# Altium schematic symbol library IC_TI.SCHLIB: 1162 symbols (part 6 of 8) (continued)
## SN74LVC1G17QDBVRQ1
designator U?
Integrated Circuit; Manufacturer_Name: Texas Instruments; Manufacturer_Part_Number: SN74LVC1G17QDBVRQ1; Datasheet Link: http://www.ti.com/lit/gpn/sn74lvc1g17-q1; Height: 1.45mm; Mouser Part Number: 595-74LVC1G17QDBVRQ1; Mouser Price/Stock: https://www.mouser.com/Search/Refine.aspx?Keyword=595-74LVC1G17QDBVRQ1
footprint SOT23-5 (SOT23, 5-Leads, Body 3.0x3.0mm (max), Pitch 0.95mm, IPC Medium Density)
pins: 1 NC, 2 A, 3 GND, 4 Y, 5 VCC

## SN74LVC1G32DBVR
designator U?
Integrated Circuit; Manufacturer_Name: Texas Instruments; Manufacturer_Part_Number: SN74LVC1G32DBVR; Datasheet Link: http://www.ti.com/lit/gpn/sn74lvc1g32; Height: 1.45mm; Mouser Part Number: 595-SN74LVC1G32DBVR; Mouser Price/Stock: https://www.mouser.com/Search/Refine.aspx?Keyword=595-SN74LVC1G32DBVR; RS Part Number: 1788963; RS Price/Stock: http://uk.rs-online.com/web/p/products/1788963
footprint SOT23-5 (SOT23, 5-Leads, Body 3.0x3.0mm (max), Pitch 0.95mm, IPC Medium Density)
pins: 1 A, 2 B, 3 GND, 4 Y, 5 VCC

## SN74LVC1G66DBVRG4
designator U?
Integrated Circuit; Manufacturer_Name: Texas Instruments; Manufacturer_Part_Number: SN74LVC1G66DBVRG4; Datasheet Link: http://www.ti.com/lit/ds/symlink/sn74lvc1g66.pdf; Height: 1.45mm; Mouser Part Number: 595-SN74LVC1G66DBVRG; Mouser Price/Stock: https://www.mouser.com/Search/Refine.aspx?Keyword=595-SN74LVC1G66DBVRG
footprint SOT23-5 (SOT23, 5-Leads, Body 3.0x3.0mm (max), Pitch 0.95mm, IPC Medium Density)
pins: 1 A, 2 B, 3 GND, 4 C, 5 VCC

## SN74LVC1G79DCKT
designator U?
Integrated Circuit; Manufacturer_Name: Texas Instruments; Manufacturer_Part_Number: SN74LVC1G79DCKT; Datasheet Link: http://www.ti.com/lit/ds/symlink/sn74lvc1g79.pdf; Height: 1.1mm; Mouser Part Number: 595-SN74LVC1G79DCKT; Mouser Price/Stock: https://www.mouser.com/Search/Refine.aspx?Keyword=595-SN74LVC1G79DCKT; RS Part Number: 6628806P; RS Price/Stock: http://uk.rs-online.com/web/p/products/6628806P
footprint SOT353
pins: 1 D, 2 CLK, 3 GND, 4 Q, 5 VCC

## SN74LVC1G80DBVT
designator U?
Integrated Circuit; Manufacturer_Name: Texas Instruments; Manufacturer_Part_Number: SN74LVC1G80DBVT; Mouser Part Number: 595-SN74LVC1G80DBVT; Mouser Price/Stock: https://www.mouser.com/Search/Refine.aspx?Keyword=595-SN74LVC1G80DBVT; RS Part Number: 1455779; RS Price/Stock: http://uk.rs-online.com/web/p/products/1455779
footprint SOT23-5 (SOT23, 5-Leads, Body 3.0x3.0mm (max), Pitch 0.95mm, IPC Medium Density)
pins: 1 D, 2 CLK, 3 GND, 4 ~Q, 5 VCC

## SN74LVC1G86DCKR
designator U?
Integrated Circuit; Manufacturer_Name: Texas Instruments; Manufacturer_Part_Number: SN74LVC1G86DCKR; Datasheet Link: http://www.ti.com/lit/gpn/sn74lvc1g86; Mouser Part Number: 595-SN74LVC1G86DCKR; Mouser Price/Stock: https://www.mouser.com/Search/Refine.aspx?Keyword=595-SN74LVC1G86DCKR; RS Part Number: 7968256P; RS Price/Stock: http://uk.rs-online.com/web/p/products/7968256P
footprint SOT353
pins: 1 A, 2 B, 3 GND, 4 Y, 5 VCC

## SN74LVC1G123DCUR
designator U??
Undefined or Miscellaneous; Manufacturer_Name: Texas Instruments; Manufacturer_Part_Number: SN74LVC1G123DCUR; Datasheet Link: http://www.ti.com/lit/gpn/sn74lvc1g123; Height: 0.9mm; Mouser Part Number: 595-SN74LVC1G123DCUR; Mouser Price/Stock: https://www.mouser.com/Search/Refine.aspx?Keyword=595-SN74LVC1G123DCUR
footprint VSSOP8_0.5(3X2)
pins: 1 ~{A} (in), 2 B (in), 3 ~{CLR}, 4 GND (power), 5 Q (out), 6 CEXT, 7 REXT/CEXT, 8 VCC (power)

## SN74LVC1G125DBVR
designator U?
Integrated Circuit; Manufacturer_Name: Texas Instruments; Manufacturer_Part_Number: SN74LVC1G125DBVR; Datasheet Link: http://www.ti.com/lit/ds/symlink/sn74lvc1g125.pdf; Height: 1.45mm; Mouser Part Number: 595-SN74LVC1G125DBVR; Mouser Price/Stock: https://www.mouser.com/Search/Refine.aspx?Keyword=595-SN74LVC1G125DBVR; RS Part Number: 1218441; RS Price/Stock: http://uk.rs-online.com/web/p/products/1218441
footprint SOT23-5 (SOT23, 5-Leads, Body 3.0x3.0mm (max), Pitch 0.95mm, IPC Medium Density)
pins: 1 ~{OE}, 2 A, 3 GND (power), 4 Y, 5 VCC (power)

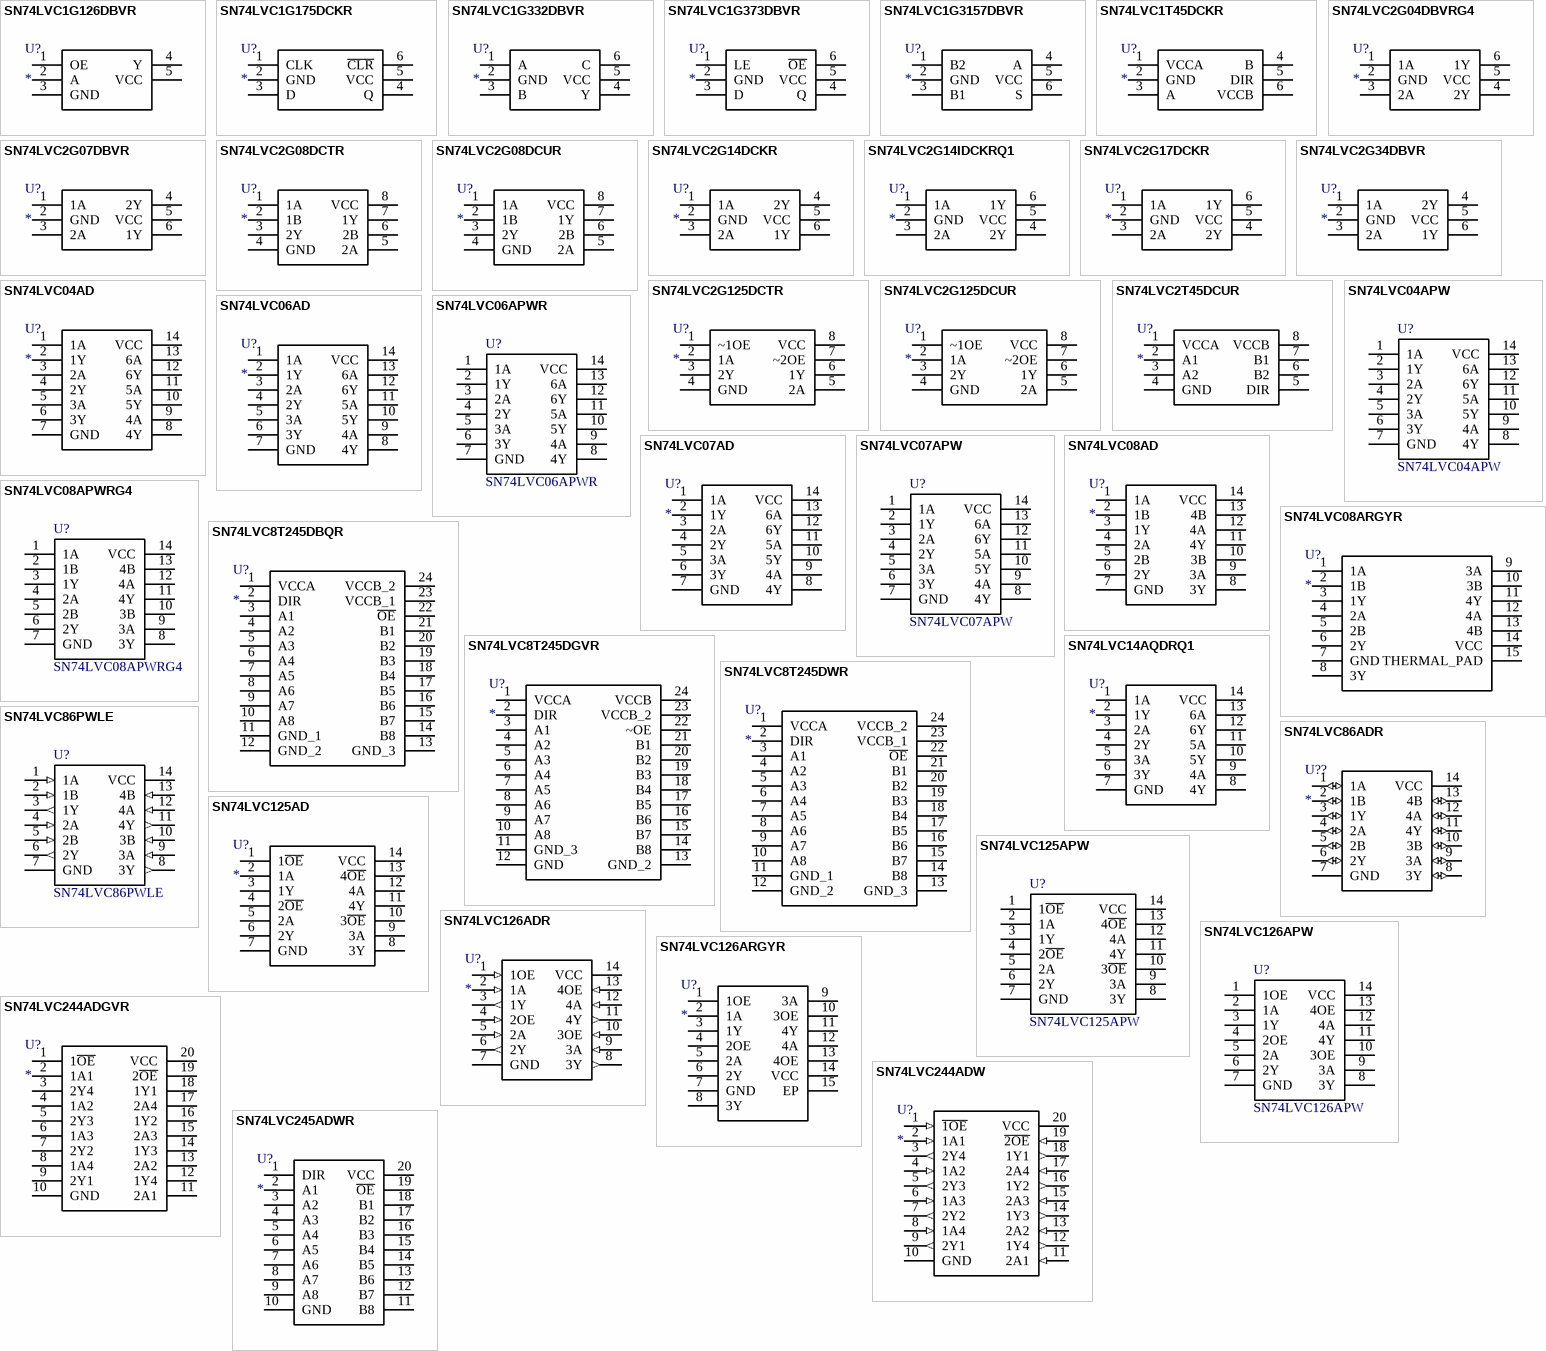
[diagram p24: symbols SN74LVC1G126DBVR to SN74LVC245ADWR]

## SN74LVC1G126DBVR
designator U?
Integrated Circuit; Manufacturer_Name: Texas Instruments; Manufacturer_Part_Number: SN74LVC1G126DBVR; Datasheet Link: http://www.ti.com/lit/ds/symlink/sn74lvc1g126.pdf; Height: 1.45mm; Mouser Part Number: 595-SN74LVC1G126DBVR; Mouser Price/Stock: https://www.mouser.com/Search/Refine.aspx?Keyword=595-SN74LVC1G126DBVR; RS Part Number: 1626704; RS Price/Stock: http://uk.rs-online.com/web/p/products/1626704
footprint SOT23-5 (SOT23, 5-Leads, Body 3.0x3.0mm (max), Pitch 0.95mm, IPC Medium Density)
pins: 1 OE, 2 A, 3 GND, 4 Y, 5 VCC

## SN74LVC1G175DCKR
designator U?
Integrated Circuit; Manufacturer_Name: Texas Instruments; Manufacturer_Part_Number: SN74LVC1G175DCKR; Datasheet Link: http://www.ti.com/lit/gpn/sn74lvc1g175; Height: 1.1mm; Mouser Part Number: 595-SN74LVC1G175DCKR; Mouser Price/Stock: https://www.mouser.com/Search/Refine.aspx?Keyword=595-SN74LVC1G175DCKR
footprint SC70-6 (SOT23, 6-Leads, Body 2.2x2.4mm (max), Pitch 0.65mm, IPC Medium Density)
pins: 1 CLK, 2 GND, 3 D, 4 Q, 5 VCC, 6 ~{CLR}

## SN74LVC1G332DBVR
designator U?
Integrated Circuit; Manufacturer_Name: Texas Instruments; Manufacturer_Part_Number: SN74LVC1G332DBVR; Datasheet Link: http://uk.rs-online.com/web/p/products/8096006; Height: 1.45mm; Mouser Part Number: 595-SN74LVC1G332DBVR; Mouser Price/Stock: https://www.mouser.com/Search/Refine.aspx?Keyword=595-SN74LVC1G332DBVR; RS Part Number: 1626715; RS Price/Stock: http://uk.rs-online.com/web/p/products/1626715
footprint SOT23-6
pins: 1 A, 2 GND, 3 B, 4 Y, 5 VCC, 6 C

## SN74LVC1G373DBVR
designator U?
Integrated Circuit; Manufacturer_Name: Texas Instruments; Manufacturer_Part_Number: SN74LVC1G373DBVR; Datasheet Link: http://www.ti.com/lit/gpn/sn74lvc1g373; Height: 1.45mm; Mouser Part Number: 595-SN74LVC1G373DBVR; Mouser Price/Stock: https://www.mouser.com/Search/Refine.aspx?Keyword=595-SN74LVC1G373DBVR
footprint SOT23-6
pins: 1 LE, 2 GND, 3 D, 4 Q, 5 VCC, 6 ~{OE}

## SN74LVC1G3157DBVR
designator U?
Integrated Circuit; Manufacturer_Name: Texas Instruments; Manufacturer_Part_Number: SN74LVC1G3157DBVR; Datasheet Link: http://componentsearchengine.com/Datasheets/1/SN74LVC1G3157DBVR.pdf; Mouser Part Number: 595-SN74LVC1G3157DBV; Mouser Price/Stock: https://www.mouser.com/Search/Refine.aspx?Keyword=595-SN74LVC1G3157DBV; RS Part Number: 1626711; RS Price/Stock: http://uk.rs-online.com/web/p/products/1626711
footprint SOT23-6
pins: 1 B2, 2 GND, 3 B1, 4 A, 5 VCC, 6 S

## SN74LVC1T45DCKR
designator U?
Integrated Circuit; Manufacturer_Name: Texas Instruments; Manufacturer_Part_Number: SN74LVC1T45DCKR; Datasheet Link: http://www.ti.com/lit/gpn/sn74lvc1t45; Mouser Part Number: 595-SN74LVC1T45DCKR; Mouser Price/Stock: https://www.mouser.com/Search/Refine.aspx?Keyword=595-SN74LVC1T45DCKR; RS Part Number: 7968262P; RS Price/Stock: http://uk.rs-online.com/web/p/products/7968262P
footprint SOT363
pins: 1 VCCA, 2 GND, 3 A, 4 B, 5 DIR, 6 VCCB

## SN74LVC2G04DBVRG4
designator U?
Integrated Circuit; Manufacturer_Name: Texas Instruments; Manufacturer_Part_Number: SN74LVC2G04DBVRG4; Datasheet Link: http://www.ti.com/lit/ds/symlink/sn74lvc2g04.pdf; Height: 1.45mm; Mouser Part Number: 595-74LVC2G04DBVRG4; Mouser Price/Stock: https://www.mouser.com/Search/Refine.aspx?Keyword=595-74LVC2G04DBVRG4
footprint SOT23-6
pins: 1 1A, 2 GND, 3 2A, 4 2Y, 5 VCC, 6 1Y

## SN74LVC2G07DBVR
designator U?
Integrated Circuit; Manufacturer_Name: Texas Instruments; Manufacturer_Part_Number: SN74LVC2G07DBVR; Datasheet Link: http://componentsearchengine.com/Datasheets/3/SN74LVC2G07DBVR.pdf; Mouser Part Number: 595-SN74LVC2G07DBVR; Mouser Price/Stock: https://www.mouser.com/Search/Refine.aspx?Keyword=595-SN74LVC2G07DBVR; RS Part Number: 6628913P; RS Price/Stock: http://uk.rs-online.com/web/p/products/6628913P
footprint SOT23-6
pins: 1 1A, 2 GND, 3 2A, 4 2Y, 5 VCC, 6 1Y

## SN74LVC2G08DCTR
designator U?
Integrated Circuit; Manufacturer_Name: Texas Instruments; Manufacturer_Part_Number: SN74LVC2G08DCTR; Datasheet Link: http://www.ti.com/lit/ds/symlink/sn74lvc2g08.pdf; Height: 1.3mm; Mouser Part Number: 595-SN74LVC2G08DCTR; Mouser Price/Stock: https://www.mouser.com/Search/Refine.aspx?Keyword=595-SN74LVC2G08DCTR; RS Part Number: 1627492; RS Price/Stock: http://uk.rs-online.com/web/p/products/1627492
footprint VSSOP8_0.65(4X3)
pins: 1 1A, 2 1B, 3 2Y, 4 GND (power), 5 2A, 6 2B, 7 1Y, 8 VCC (power)

## SN74LVC2G08DCUR
designator U?
Integrated Circuit; Manufacturer_Name: Texas Instruments; Manufacturer_Part_Number: SN74LVC2G08DCUR; Datasheet Link: http://www.ti.com/lit/ds/symlink/sn74lvc2g08.pdf; Height: 0.9mm; Mouser Part Number: 595-SN74LVC2G08DCUR; Mouser Price/Stock: https://www.mouser.com/Search/Refine.aspx?Keyword=595-SN74LVC2G08DCUR; RS Part Number: 1626723; RS Price/Stock: http://uk.rs-online.com/web/p/products/1626723
footprint VSSOP8_0.5(3X2)
pins: 1 1A, 2 1B, 3 2Y, 4 GND (power), 5 2A, 6 2B, 7 1Y, 8 VCC (power)

## SN74LVC2G14DCKR
designator U?
Integrated Circuit; Manufacturer_Name: Texas Instruments; Manufacturer_Part_Number: SN74LVC2G14DCKR; Datasheet Link: http://www.ti.com/lit/gpn/sn74lvc2g14; Mouser Part Number: 595-SN74LVC2G14DCKR; Mouser Price/Stock: https://www.mouser.com/Search/Refine.aspx?Keyword=595-SN74LVC2G14DCKR
footprint SOT363
pins: 1 1A, 2 GND, 3 2A, 4 2Y, 5 VCC, 6 1Y

## SN74LVC2G14IDCKRQ1
designator U?
Integrated Circuit; Manufacturer_Name: Texas Instruments; Manufacturer_Part_Number: SN74LVC2G14IDCKRQ1; Datasheet Link: http://www.ti.com/lit/ds/symlink/sn74lvc2g14-q1.pdf; Height: 1.1mm; Mouser Part Number: 595-SN74LVC2G14IDCQ1; Mouser Price/Stock: https://www.mouser.com/Search/Refine.aspx?Keyword=595-SN74LVC2G14IDCQ1; RS Part Number: 6628932P; RS Price/Stock: http://uk.rs-online.com/web/p/products/6628932P
footprint SOT363
pins: 1 1A, 2 GND (power), 3 2A, 4 2Y, 5 VCC (power), 6 1Y

## SN74LVC2G17DCKR
designator U?
Integrated Circuit; Manufacturer_Name: Texas Instruments; Manufacturer_Part_Number: SN74LVC2G17DCKR; Datasheet Link: http://docs-emea.rs-online.com/webdocs/13f6/0900766b813f622d.pdf; Height: 1.1mm; Mouser Part Number: 595-SN74LVC2G17DCKR; Mouser Price/Stock: https://www.mouser.com/Search/Refine.aspx?Keyword=595-SN74LVC2G17DCKR; RS Part Number: 6628948P; RS Price/Stock: http://uk.rs-online.com/web/p/products/6628948P
footprint SC70-6 (SOT23, 6-Leads, Body 2.2x2.4mm (max), Pitch 0.65mm, IPC Medium Density)
pins: 1 1A, 2 GND (power), 3 2A, 4 2Y, 5 VCC (power), 6 1Y

## SN74LVC2G34DBVR
designator U?
Integrated Circuit; Manufacturer_Name: Texas Instruments; Manufacturer_Part_Number: SN74LVC2G34DBVR; Datasheet Link: http://www.ti.com/lit/gpn/sn74lvc2g34; Mouser Part Number: 595-SN74LVC2G34DBVR; Mouser Price/Stock: https://www.mouser.com/Search/Refine.aspx?Keyword=595-SN74LVC2G34DBVR; RS Part Number: 6628963P; RS Price/Stock: http://uk.rs-online.com/web/p/products/6628963P
footprint SOT23-6
pins: 1 1A, 2 GND, 3 2A, 4 2Y, 5 VCC, 6 1Y

## SN74LVC2G125DCTR
designator U?
Integrated Circuit; Manufacturer_Name: Texas Instruments; Manufacturer_Part_Number: SN74LVC2G125DCTR; Datasheet Link: http://www.ti.com/lit/gpn/sn74lvc2g125; Mouser Part Number: 595-SN74LVC2G125DCTR; Mouser Price/Stock: https://www.mouser.com/Search/Refine.aspx?Keyword=595-SN74LVC2G125DCTR; RS Part Number: 8096043P; RS Price/Stock: http://uk.rs-online.com/web/p/products/8096043P
footprint VSSOP8_0.65(4X3)
pins: 1 ~1OE, 2 1A, 3 2Y, 4 GND, 5 2A, 6 1Y, 7 ~2OE, 8 VCC

## SN74LVC2G125DCUR
designator U?
Integrated Circuit; Manufacturer_Name: Texas Instruments; Manufacturer_Part_Number: SN74LVC2G125DCUR; Datasheet Link: http://www.ti.com/lit/gpn/sn74lvc2g125; Mouser Part Number: 595-SN74LVC2G125DCUR; Mouser Price/Stock: https://www.mouser.com/Search/Refine.aspx?Keyword=595-SN74LVC2G125DCUR; RS Part Number: 1626725; RS Price/Stock: http://uk.rs-online.com/web/p/products/1626725
footprint VSSOP8_0.5(3X2)
pins: 1 ~1OE, 2 1A, 3 2Y, 4 GND, 5 2A, 6 1Y, 7 ~2OE, 8 VCC

## SN74LVC2T45DCUR
designator U?
Integrated Circuit; Manufacturer_Name: Texas Instruments; Manufacturer_Part_Number: SN74LVC2T45DCUR; Datasheet Link: http://www.ti.com/lit/gpn/sn74lvc2t45; Height: 0.9mm; Mouser Part Number: 595-SN74LVC2T45DCUR; Mouser Price/Stock: https://www.mouser.com/Search/Refine.aspx?Keyword=595-SN74LVC2T45DCUR; RS Part Number: 1684367; RS Price/Stock: http://uk.rs-online.com/web/p/products/1684367
footprint VSSOP8_0.5(3X2)
pins: 1 VCCA, 2 A1, 3 A2, 4 GND, 5 DIR, 6 B2, 7 B1, 8 VCCB

## SN74LVC04AD
designator U?
Integrated Circuit; Manufacturer_Name: Texas Instruments; Manufacturer_Part_Number: SN74LVC04AD; Datasheet Link: http://www.ti.com/lit/ds/symlink/sn74lvc04a.pdf; Height: 1.75mm; Mouser Part Number: 595-SN74LVC04AD; Mouser Price/Stock: https://www.mouser.com/Search/Refine.aspx?Keyword=595-SN74LVC04AD; RS Part Number: 0528101; RS Price/Stock: http://uk.rs-online.com/web/p/products/0528101
footprint SOIC14_1.27
pins: 1 1A, 2 1Y, 3 2A, 4 2Y, 5 3A, 6 3Y, 7 GND (power), 8 4Y, 9 4A, 10 5Y, 11 5A, 12 6Y, 13 6A, 14 VCC (power)

## SN74LVC04APW
designator U?
Integrated Circuit; Manufacturer_Name: Texas Instruments; Datasheet Link: http://www.ti.com/lit/gpn/sn74lvc04a; Manufacturer_Part_Number: SN74LVC04APW; Mouser Part Number: 595-SN74LVC04APW; Mouser Price/Stock: https://www.mouser.com/Search/Refine.aspx?Keyword=595-SN74LVC04APW
footprint TSSOP14_0.65 (TSOP, 14-Leads, Body 5.00x4.40mm, Pitch 0.65mm, Thermal Pad 2.31x2.46mm, IPC Low Density)
pins: 1 1A, 2 1Y, 3 2A, 4 2Y, 5 3A, 6 3Y, 7 GND, 8 4Y, 9 4A, 10 5Y, 11 5A, 12 6Y, 13 6A, 14 VCC

## SN74LVC06AD
designator U?
Integrated Circuit; Manufacturer_Name: Texas Instruments; Manufacturer_Part_Number: SN74LVC06AD; Datasheet Link: http://docs-emea.rs-online.com/webdocs/0b85/0900766b80b85ff1.pdf; Height: 1.75mm; Mouser Part Number: 595-SN74LVC06AD; Mouser Price/Stock: https://www.mouser.com/Search/Refine.aspx?Keyword=595-SN74LVC06AD; RS Part Number: 0527417; RS Price/Stock: http://uk.rs-online.com/web/p/products/0527417
footprint SOIC14_1.27
pins: 1 1A, 2 1Y, 3 2A, 4 2Y, 5 3A, 6 3Y, 7 GND (power), 8 4Y, 9 4A, 10 5Y, 11 5A, 12 6Y, 13 6A, 14 VCC (power)

## SN74LVC06APWR
designator U?
Integrated Circuit; Manufacturer_Name: Texas Instruments; Datasheet Link: http://www.ti.com/lit/gpn/sn74lvc06a; Height: 1.2mm; Manufacturer_Part_Number: SN74LVC06APWR; Mouser Part Number: 595-SN74LVC06APWR; Mouser Price/Stock: https://www.mouser.com/Search/Refine.aspx?Keyword=595-SN74LVC06APWR; RS Part Number: 1457373; RS Price/Stock: http://uk.rs-online.com/web/p/products/1457373
footprint TSSOP14_0.65 (TSOP, 14-Leads, Body 5.00x4.40mm, Pitch 0.65mm, Thermal Pad 2.31x2.46mm, IPC Low Density)
pins: 1 1A, 2 1Y, 3 2A, 4 2Y, 5 3A, 6 3Y, 7 GND, 8 4Y, 9 4A, 10 5Y, 11 5A, 12 6Y, 13 6A, 14 VCC

## SN74LVC07AD
designator U?
Integrated Circuit; Manufacturer_Name: Texas Instruments; Manufacturer_Part_Number: SN74LVC07AD; Datasheet Link: http://www.ti.com/lit/ds/symlink/sn74lvc07a.pdf; Height: 1.75mm; Mouser Part Number: 595-SN74LVC07AD; Mouser Price/Stock: https://www.mouser.com/Search/Refine.aspx?Keyword=595-SN74LVC07AD; RS Part Number: 0527407; RS Price/Stock: http://uk.rs-online.com/web/p/products/0527407
footprint SOIC14_1.27
pins: 1 1A, 2 1Y, 3 2A, 4 2Y, 5 3A, 6 3Y, 7 GND (power), 8 4Y, 9 4A, 10 5Y, 11 5A, 12 6Y, 13 6A, 14 VCC (power)

## SN74LVC07APW
designator U?
Integrated Circuit; Manufacturer_Name: Texas Instruments; Datasheet Link: http://www.ti.com/lit/ds/symlink/sn74lvc07a.pdf; Height: 1.2mm; Manufacturer_Part_Number: SN74LVC07APW; Mouser Part Number: 595-SN74LVC07APW; Mouser Price/Stock: https://www.mouser.com/Search/Refine.aspx?Keyword=595-SN74LVC07APW; RS Part Number: 0527889; RS Price/Stock: http://uk.rs-online.com/web/p/products/0527889
footprint TSSOP14_0.65 (TSOP, 14-Leads, Body 5.00x4.40mm, Pitch 0.65mm, Thermal Pad 2.31x2.46mm, IPC Low Density)
pins: 1 1A, 2 1Y, 3 2A, 4 2Y, 5 3A, 6 3Y, 7 GND (power), 8 4Y, 9 4A, 10 5Y, 11 5A, 12 6Y, 13 6A, 14 VCC (power)

## SN74LVC08AD
designator U?
Integrated Circuit; Manufacturer_Name: Texas Instruments; Manufacturer_Part_Number: SN74LVC08AD; Datasheet Link: http://www.ti.com/lit/ds/symlink/sn74lvc08a.pdf; Height: 1.75mm; Mouser Part Number: 595-SN74LVC08AD; Mouser Price/Stock: https://www.mouser.com/Search/Refine.aspx?Keyword=595-SN74LVC08AD; RS Part Number: 6632805; RS Price/Stock: http://uk.rs-online.com/web/p/products/6632805
footprint SOIC14_1.27
pins: 1 1A, 2 1B, 3 1Y, 4 2A, 5 2B, 6 2Y, 7 GND (power), 8 3Y, 9 3A, 10 3B, 11 4Y, 12 4A, 13 4B, 14 VCC (power)

## SN74LVC08APWRG4
designator U?
Integrated Circuit; Manufacturer_Name: Texas Instruments; Datasheet Link: http://www.ti.com/lit/ds/symlink/sn74lvc08a.pdf; Height: 1.2mm; Manufacturer_Part_Number: SN74LVC08APWRG4; Mouser Part Number: 595-SN74LVC08APWRG4; Mouser Price/Stock: https://www.mouser.com/Search/Refine.aspx?Keyword=595-SN74LVC08APWRG4
footprint TSSOP14_0.65 (TSOP, 14-Leads, Body 5.00x4.40mm, Pitch 0.65mm, Thermal Pad 2.31x2.46mm, IPC Low Density)
pins: 1 1A, 2 1B, 3 1Y, 4 2A, 5 2B, 6 2Y, 7 GND, 8 3Y, 9 3A, 10 3B, 11 4Y, 12 4A, 13 4B, 14 VCC

## SN74LVC08ARGYR
designator U?
Integrated Circuit; Manufacturer_Name: Texas Instruments; Manufacturer_Part_Number: SN74LVC08ARGYR; Datasheet Link: http://www.ti.com/lit/ds/symlink/sn74lvc08a.pdf; Mouser Part Number: 595-SN74LVC08ARGYR; Mouser Price/Stock: https://www.mouser.com/Search/Refine.aspx?Keyword=595-SN74LVC08ARGYR; RS Part Number: 6628597P; RS Price/Stock: http://uk.rs-online.com/web/p/products/6628597P
footprint VQFN14_0.5-PAD(3.5X3.5)
pins: 1 1A, 2 1B, 3 1Y, 4 2A, 5 2B, 6 2Y, 7 GND (power), 8 3Y, 9 3A, 10 3B, 11 4Y, 12 4A, 13 4B, 14 VCC (power), 15 THERMAL_PAD

## SN74LVC8T245DBQR
designator U?
Integrated Circuit; Manufacturer_Name: Texas Instruments; Manufacturer_Part_Number: SN74LVC8T245DBQR; Datasheet Link: http://www.ti.com/lit/gpn/sn74lvc8t245; Height: 1.75mm; Mouser Part Number: 595-SN74LVC8T245DBQR; Mouser Price/Stock: https://www.mouser.com/Search/Refine.aspx?Keyword=595-SN74LVC8T245DBQR; RS Part Number: 8143912P; RS Price/Stock: http://uk.rs-online.com/web/p/products/8143912P
footprint SSOP24_0.635
pins: 1 VCCA, 2 DIR, 3 A1, 4 A2, 5 A3, 6 A4, 7 A5, 8 A6, 9 A7, 10 A8, 11 GND_1, 12 GND_2, 13 GND_3, 14 B8, 15 B7, 16 B6, 17 B5, 18 B4, 19 B3, 20 B2, 21 B1, 22 ~{OE}, 23 VCCB_1, 24 VCCB_2

## SN74LVC8T245DGVR
designator U?
Integrated Circuit; Manufacturer_Name: Texas Instruments; Manufacturer_Part_Number: SN74LVC8T245DGVR; Datasheet Link: http://www.ti.com/lit/gpn/sn74lvc8t245; Mouser Part Number: 595-SN74LVC8T245DGVR; Mouser Price/Stock: https://www.mouser.com/Search/Refine.aspx?Keyword=595-SN74LVC8T245DGVR; RS Part Number: 6629109P; RS Price/Stock: http://uk.rs-online.com/web/p/products/6629109P
footprint TSSOP24_0.4
pins: 1 VCCA, 2 DIR, 3 A1, 4 A2, 5 A3, 6 A4, 7 A5, 8 A6, 9 A7, 10 A8, 11 GND_3, 12 GND, 13 GND_2, 14 B8, 15 B7, 16 B6, 17 B5, 18 B4, 19 B3, 20 B2, 21 B1, 22 ~OE, 23 VCCB_2, 24 VCCB

## SN74LVC8T245DWR
designator U?
Integrated Circuit; Manufacturer_Name: Texas Instruments; Manufacturer_Part_Number: SN74LVC8T245DWR; Datasheet Link: http://www.ti.com/lit/gpn/sn74lvc8t245; Height: 2.65mm; Mouser Part Number: 595-SN74LVC8T245DWR; Mouser Price/Stock: https://www.mouser.com/Search/Refine.aspx?Keyword=595-SN74LVC8T245DWR; RS Part Number: 8253479P; RS Price/Stock: http://uk.rs-online.com/web/p/products/8253479P
footprint SOIC24W_1.27
pins: 1 VCCA, 2 DIR, 3 A1, 4 A2, 5 A3, 6 A4, 7 A5, 8 A6, 9 A7, 10 A8, 11 GND_1, 12 GND_2, 13 GND_3, 14 B8, 15 B7, 16 B6, 17 B5, 18 B4, 19 B3, 20 B2, 21 B1, 22 ~{OE}, 23 VCCB_1, 24 VCCB_2

## SN74LVC14AQDRQ1
designator U?
Integrated Circuit; Manufacturer_Name: Texas Instruments; Manufacturer_Part_Number: SN74LVC14AQDRQ1; Datasheet Link: http://www.ti.com/lit/ds/symlink/sn74lvc14a-q1.pdf; Height: 1.75mm; Mouser Part Number: 595-SN74LVC14AQDRQ1; Mouser Price/Stock: https://www.mouser.com/Search/Refine.aspx?Keyword=595-SN74LVC14AQDRQ1
footprint SOIC14_1.27
pins: 1 1A, 2 1Y, 3 2A, 4 2Y, 5 3A, 6 3Y, 7 GND, 8 4Y, 9 4A, 10 5Y, 11 5A, 12 6Y, 13 6A, 14 VCC

## SN74LVC86ADR
designator U??
Undefined or Miscellaneous; Manufacturer_Name: Texas Instruments; Manufacturer_Part_Number: SN74LVC86ADR; Datasheet Link: http://www.ti.com/lit/gpn/sn74lvc86a; Height: 1.75mm; Mouser Part Number: 595-SN74LVC86ADR; Mouser Price/Stock: https://www.mouser.com/Search/Refine.aspx?Keyword=595-SN74LVC86ADR; RS Part Number: 1792134; RS Price/Stock: http://uk.rs-online.com/web/p/products/1792134
footprint SOIC14_1.27
pins: 1 1A (io), 2 1B (io), 3 1Y (io), 4 2A (io), 5 2B (io), 6 2Y (io), 7 GND (power), 8 3Y (io), 9 3A (io), 10 3B (io), 11 4Y (io), 12 4A (io), 13 4B (io), 14 VCC (power)

## SN74LVC86PWLE
designator U?
Integrated Circuit; Manufacturer_Name: Texas Instruments; Datasheet Link: http://www.ti.com/lit/ds/symlink/sn74lvc86a-q1.pdf; Height: 1.2mm; Manufacturer_Part_Number: SN74LVC86PWLE; Mouser Part Number: N/A
footprint TSSOP14_0.65 (TSOP, 14-Leads, Body 5.00x4.40mm, Pitch 0.65mm, Thermal Pad 2.31x2.46mm, IPC Low Density)
pins: 1 1A (in), 2 1B (in), 3 1Y (out), 4 2A (in), 5 2B (in), 6 2Y (out), 7 GND (power), 8 3Y (out), 9 3A (in), 10 3B (in), 11 4Y (out), 12 4A (in), 13 4B (in), 14 VCC (power)

## SN74LVC125AD
designator U?
Integrated Circuit; Manufacturer_Name: Texas Instruments; Manufacturer_Part_Number: SN74LVC125AD; Datasheet Link: http://www.ti.com/lit/ds/symlink/sn74lvc125a.pdf; Height: 1.75mm; Mouser Part Number: 595-SN74LVC125AD; Mouser Price/Stock: https://www.mouser.com/Search/Refine.aspx?Keyword=595-SN74LVC125AD; RS Part Number: 6632811P; RS Price/Stock: http://uk.rs-online.com/web/p/products/6632811P
footprint SOIC14_1.27
pins: 1 1~{OE}, 2 1A, 3 1Y, 4 2~{OE}, 5 2A, 6 2Y, 7 GND (power), 8 3Y, 9 3A, 10 3~{OE}, 11 4Y, 12 4A, 13 4~{OE}, 14 VCC (power)

## SN74LVC125APW
designator U?
Integrated Circuit; Manufacturer_Name: Texas Instruments; Datasheet Link: http://www.ti.com/lit/ds/symlink/sn74lvc125a.pdf; Height: 1.2mm; Manufacturer_Part_Number: SN74LVC125APW; Mouser Part Number: 595-SN74LVC125APW; Mouser Price/Stock: https://www.mouser.com/Search/Refine.aspx?Keyword=595-SN74LVC125APW; RS Part Number: 0527479; RS Price/Stock: http://uk.rs-online.com/web/p/products/0527479
footprint TSSOP14_0.65 (TSOP, 14-Leads, Body 5.00x4.40mm, Pitch 0.65mm, Thermal Pad 2.31x2.46mm, IPC Low Density)
pins: 1 1~{OE}, 2 1A, 3 1Y, 4 2~{OE}, 5 2A, 6 2Y, 7 GND (power), 8 3Y, 9 3A, 10 3~{OE}, 11 4Y, 12 4A, 13 4~{OE}, 14 VCC (power)

## SN74LVC126ADR
designator U?
Integrated Circuit; Manufacturer_Name: Texas Instruments; Manufacturer_Part_Number: SN74LVC126ADR; Datasheet Link: http://www.ti.com/lit/gpn/sn74lvc126a; Height: 1.75mm; Mouser Part Number: 595-SN74LVC126ADR; Mouser Price/Stock: https://www.mouser.com/Search/Refine.aspx?Keyword=595-SN74LVC126ADR; RS Part Number: 1627451; RS Price/Stock: http://uk.rs-online.com/web/p/products/1627451
footprint SOIC14_1.27
pins: 1 1OE (in), 2 1A (in), 3 1Y (out), 4 2OE (in), 5 2A (in), 6 2Y (out), 7 GND (power), 8 3Y (out), 9 3A (in), 10 3OE (in), 11 4Y (out), 12 4A (in), 13 4OE (in), 14 VCC (power)

## SN74LVC126APW
designator U?
Integrated Circuit; Manufacturer_Name: Texas Instruments; Manufacturer_Part_Number: SN74LVC126APW; Mouser Part Number: 595-SN74LVC126APW; Mouser Price/Stock: https://www.mouser.com/Search/Refine.aspx?Keyword=595-SN74LVC126APW
footprint TSSOP14_0.65 (TSOP, 14-Leads, Body 5.00x4.40mm, Pitch 0.65mm, Thermal Pad 2.31x2.46mm, IPC Low Density)
pins: 1 1OE, 2 1A, 3 1Y, 4 2OE, 5 2A, 6 2Y, 7 GND, 8 3Y, 9 3A, 10 3OE, 11 4Y, 12 4A, 13 4OE, 14 VCC

## SN74LVC126ARGYR
designator U?
Integrated Circuit; Manufacturer_Name: Texas Instruments; Manufacturer_Part_Number: SN74LVC126ARGYR; Datasheet Link: http://www.ti.com/lit/gpn/sn74lvc126a; Mouser Part Number: 595-SN74LVC126ARGYR; Mouser Price/Stock: https://www.mouser.com/Search/Refine.aspx?Keyword=595-SN74LVC126ARGYR
footprint VQFN14_0.5-PAD(3.5X3.5)
pins: 1 1OE, 2 1A, 3 1Y, 4 2OE, 5 2A, 6 2Y, 7 GND, 8 3Y, 9 3A, 10 3OE, 11 4Y, 12 4A, 13 4OE, 14 VCC, 15 EP

## SN74LVC244ADGVR
designator U?
Integrated Circuit; Manufacturer_Name: Texas Instruments; Manufacturer_Part_Number: SN74LVC244ADGVR; Datasheet Link: http://www.ti.com/lit/ds/symlink/sn74lvc244a.pdf; Height: 1.2mm; Mouser Part Number: 595-SN74LVC244ADGVR; Mouser Price/Stock: https://www.mouser.com/Search/Refine.aspx?Keyword=595-SN74LVC244ADGVR; RS Part Number: 6628859P; RS Price/Stock: http://uk.rs-online.com/web/p/products/6628859P
footprint VSSOP20_0.4(6.4X5.0)
pins: 1 1~{OE}, 2 1A1, 3 2Y4, 4 1A2, 5 2Y3, 6 1A3, 7 2Y2, 8 1A4, 9 2Y1, 10 GND, 11 2A1, 12 1Y4, 13 2A2, 14 1Y3, 15 2A3, 16 1Y2, 17 2A4, 18 1Y1, 19 2~{OE}, 20 VCC

## SN74LVC244ADW
designator U?
Integrated Circuit; Manufacturer_Name: Texas Instruments; Manufacturer_Part_Number: SN74LVC244ADW; Datasheet Link: http://www.ti.com/lit/ds/symlink/sn74lvc244a.pdf; Height: 2.65mm; Mouser Part Number: 595-SN74LVC244ADW; Mouser Price/Stock: https://www.mouser.com/Search/Refine.aspx?Keyword=595-SN74LVC244ADW; RS Part Number: 6632861P; RS Price/Stock: http://uk.rs-online.com/web/p/products/6632861P
footprint SOIC20W_1.27
pins: 1 ~{1OE} (in), 2 1A1 (in), 3 2Y4 (out), 4 1A2 (in), 5 2Y3 (out), 6 1A3 (in), 7 2Y2 (out), 8 1A4 (in), 9 2Y1 (out), 10 GND (power), 11 2A1 (in), 12 1Y4 (out), 13 2A2 (in), 14 1Y3 (out), 15 2A3 (in), 16 1Y2 (out), 17 2A4 (in), 18 1Y1 (out), 19 ~{2OE} (in), 20 VCC (power)

## SN74LVC245ADWR
designator U?
Integrated Circuit; Manufacturer_Name: Texas Instruments; Manufacturer_Part_Number: SN74LVC245ADWR; Datasheet Link: http://www.farnell.com/datasheets/1830960.pdf; Height: 2.65mm; Mouser Part Number: 595-SN74LVC245ADWR; Mouser Price/Stock: https://www.mouser.com/Search/Refine.aspx?Keyword=595-SN74LVC245ADWR; RS Part Number: 0526593; RS Price/Stock: http://uk.rs-online.com/web/p/products/0526593
footprint SOIC20W_1.27
pins: 1 DIR, 2 A1, 3 A2, 4 A3, 5 A4, 6 A5, 7 A6, 8 A7, 9 A8, 10 GND, 11 B8, 12 B7, 13 B6, 14 B5, 15 B4, 16 B3, 17 B2, 18 B1, 19 ~{OE}, 20 VCC
